# Altium footprint library 2-Pcblib_Cap.PcbLib: 73 footprints (part 5 of 5)
Each footprint in its own frame and in the unit in brackets; x right, y up, seen from the top. Pads: shape width x height; smd on the part's side, far side on the other; paste and mask are expansions set on the pad; w line width, h text height; cw(c..) or ccw(c..) is an arc to the next point about the centre after c.
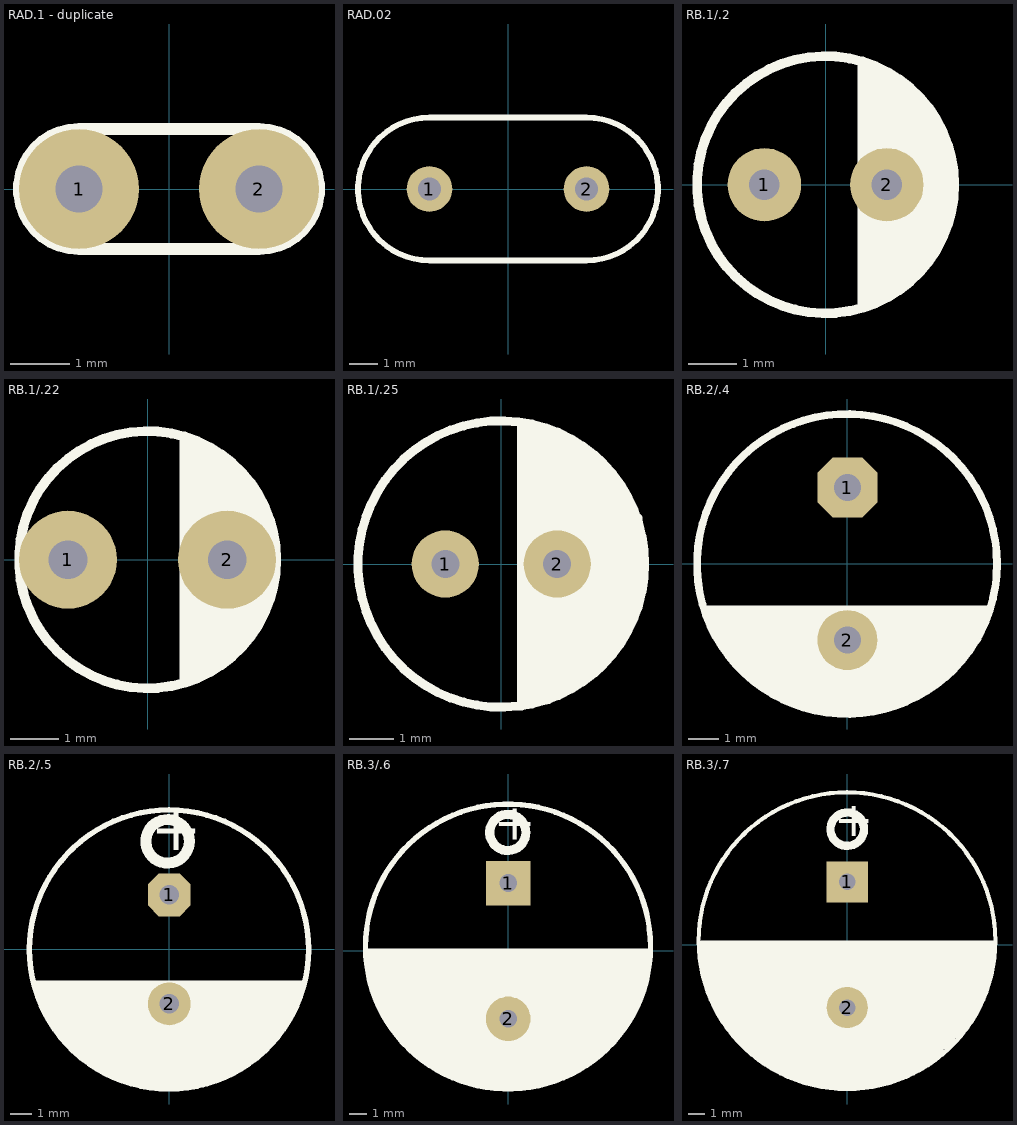
[diagram p4: the footprints below, top view; thin cyan lines are the x and y axes]

## RAD.1 - duplicate [mil]
pads (2):
  round 80 hole 31.5: 1(-60,0) 2(60,0)
Top Overlay:
  lines w8: -60,-40 cw(c-60,0) -60,40 60,40 cw(c60,0) 60,-40 -60,-40

## RAD.02 [mm]
pads (2):
  round 1.6 hole 0.8: 1(-2.75,0) 2(2.75,0)
Top Overlay:
  lines w0.2: -2.75,-2.5 cw(c-2.75,0) -2.75,2.5 2.75,2.5 cw(c2.75,0) 2.75,-2.5 -2.75,-2.5

## RB.1/.2 [mil]
pads (2):
  round 60 hole 25: 1(-50,0) 2(50,0)
Top Overlay:
  circle w8: c0,0 r105
  lines w8: 30,-100 30,100 ; 35,-95 35,95 ; 40,-90 40,95 ; 45,-90 45,90 ; 50,-90 50,85 ; 50,-85 60,-85 ; 55,-80 55,80 ; 55,85 60,80 60,-80 ; 65,-75 65,75 ; 70,-70 70,70 ; 75,-65 75,65 ; 80,-60 80,65 ; 80,-55 85,-55 ; 85,-50 85,50 85,55 ; 90,-45 90,45 ; 95,-35 95,35 ; 100,-25 100,20
Bottom Overlay:
  lines w8: 20,0 25,0
3D body: height 453.76, standoff -128.81, extent -100.43,-99 98.43,99.85

## RB.1/.22 [mil]
pads (2):
  round 80 hole 31.5: 1(-65,0) 2(65,0)
Top Overlay:
  circle w8: c0,0 r105
  lines w8: 30,-100 30,100 ; 35,-95 35,95 ; 40,-90 40,95 ; 45,-90 45,90 ; 50,-90 50,85 ; 50,-85 60,-85 ; 55,-80 55,80 ; 55,85 60,80 60,-80 ; 65,-75 65,75 ; 70,-70 70,70 ; 75,-65 75,65 ; 80,-60 80,65 ; 80,-55 85,-55 ; 85,-50 85,50 85,55 ; 90,-45 90,45 ; 95,-35 95,35 ; 100,-25 100,20
3D body: height 440.94, standoff -740.16, extent -99.43,-100 97.43,96.85

## RB.1/.25 [mil]
pads (2):
  round 60 hole 25: 1(-50,0) 2(50,0)
Top Overlay:
  circle w8: c0,0 r127.95
  lines w8: 18,-127 18,126 ; 26,-122.05 26,125 ; 26,123 33,123 34,122 34,-123 ; 42,-121 42,120 ; 50,-115 50,118 ; 58,-113 58,113 ; 66,-107 66,109 ; 74,-104 74,103 ; 82,-98 82,98 ; 90,-90 90,90 ; 98,-82 98,81 ; 106,-72 106,71 ; 114,-56 114,57 ; 122,-39 122,41
Bottom Overlay:
  lines w8: 20,0 25,0
3D body: height 512.81, standoff -118.67, extent -128,-122.02 122.03,128.02

## RB.2/.4 [mm]
pads (2):
  oct 2x2 hole 0.9: 1(0,2.54)
  round 2 hole 0.9: 2(0,-2.54)
Top Overlay:
  circle w0.254: c-0.013,-0.006 r5
  lines w0.254: -4.75,-1.524 4.724,-1.524 ; -4.648,-1.778 4.572,-1.778 ; -4.547,-2.032 4.547,-2.032 ; -4.47,-2.261 4.369,-2.261 ; -4.318,-2.489 4.343,-2.489 ; -4.14,-2.743 4.14,-2.743 ; -3.988,-2.972 3.962,-2.972 ; -3.759,-3.226 3.785,-3.226 ; -3.556,-3.454 3.505,-3.454 ; -3.302,-3.683 3.302,-3.683 ; -3.099,-3.912 3.023,-3.912 ; -2.794,-4.166 2.743,-4.166 ; -2.337,-4.42 2.337,-4.42 ; -1.803,-4.648 1.829,-4.648 ; -1.067,-4.877 1.067,-4.877
3D body: height 26.86, standoff -16, extent -5.03,-5.009 4.978,5.009

## RB.2/.5 [mm]
pads (2):
  oct 2x2 hole 0.9: 1(0,2.54)
  round 2 hole 0.9: 2(0,-2.54)
Top Overlay:
  circle w0.508: c-0.076,5.029 r1.016
  circle w0.254: c-0.013,-0.006 r6.5
  lines w0.254: -6.274,-1.575 6.172,-1.575 ; -6.248,-1.778 6.172,-1.778 ; -6.121,-1.981 6.071,-1.981 ; -6.096,-2.235 6.045,-2.235 ; -5.944,-2.464 5.893,-2.464 ; -5.817,-2.692 5.817,-2.692 ; -5.715,-2.921 5.69,-2.921 ; -5.664,-3.175 5.563,-3.175 ; -5.461,-3.404 5.461,-3.404 ; -5.385,-3.632 5.359,-3.632 ; -5.156,-3.861 5.156,-3.861 ; -5.029,-4.064 4.978,-4.064 ; -4.801,-4.318 4.826,-4.318 ; -4.623,-4.572 4.547,-4.572 ; -4.267,-4.826 4.242,-4.826 ; -4.039,-5.08 4.013,-5.08 ; -3.607,-5.334 3.658,-5.334 ; -3.251,-5.588 3.226,-5.588 ; -2.819,-5.842 2.819,-5.842 ; -2.286,-6.071 2.235,-6.071 ; -1.524,-6.299 1.549,-6.299
  text "+" at -0.864,3.912 h3.56
3D body: height 25.4, standoff -28.75, extent -6.647,-6.629 6.553,6.571

## RB.3/.6 [mm]
pads (2):
  rect 2.5x2.5 hole 1: 1(0,3.81)
  round 2.5 hole 1: 2(0,-3.81)
Top Overlay:
  circle w0.3: c-0.013,0.248 r8
  circle w0.508: c-0.025,6.655 r1.016
  lines w0.254: -8.001,0 7.925,0
  lines w0.5: -7.823,-0.787 7.798,-0.787 ; -7.798,-0.33 7.823,-0.33 ; -7.747,-1.168 7.696,-1.168 ; -7.671,-1.626 7.62,-1.626 ; -7.569,-2.032 7.493,-2.032 ; -7.417,-2.464 7.366,-2.464 ; -7.29,-2.743 7.264,-2.743 ; -7.137,-3.099 7.061,-3.099 ; -6.858,-3.454 6.883,-3.454 ; -6.604,-3.861 6.68,-3.861 ; -6.426,-4.191 6.477,-4.191 ; -6.198,-4.547 6.248,-4.547 ; -6.045,-4.801 5.994,-4.801 ; -5.664,-5.232 5.639,-5.232 ; -5.156,-5.563 5.334,-5.563 ; -4.877,-5.842 5.004,-5.842 ; -4.496,-6.096 4.674,-6.096 ; -4.039,-6.426 4.267,-6.376 ; -3.556,-6.655 3.861,-6.604 ; -3.099,-6.883 3.302,-6.883 ; -2.565,-7.137 2.591,-7.137 ; -1.753,-7.391 1.956,-7.391
  text "+" at -0.813,5.537 h3.56
3D body: height 25.01, standoff -2.7, extent -7.975,-7.686 8.025,8.255

## RB.3/.7 [mm]
pads (2):
  rect 2.5x2.5 hole 1: 1(0,3.81)
  round 2.5 hole 1: 2(0,-3.81)
Top Overlay:
  circle w0.508: c0,7.01 r1.016
  circle w0.254: c-0.013,0.248 r9
  lines w0.5: -8.8,0 8.8,0 ; -8.775,-0.991 8.7,-0.991 ; -8.698,-1.397 8.6,-1.397 ; -8.648,-1.753 8.6,-1.753 ; -8.521,-2.159 8.5,-2.159 ; -8.368,-2.515 8.357,-2.515 ; -8.216,-2.896 8.255,-2.896 ; -8.103,-3.251 8.077,-3.251 ; -7.886,-3.632 7.925,-3.632 ; -7.759,-4.039 7.671,-4.039 ; -7.505,-4.42 7.391,-4.42 ; -7.301,-4.75 7.264,-4.75 ; -6.971,-5.055 7.01,-5.055 ; -6.768,-5.41 6.731,-5.41 ; -6.438,-5.766 6.35,-5.766 ; -6.158,-6.096 6.096,-6.096 ; -5.777,-6.502 5.664,-6.502 ; -5.295,-6.858 5.283,-6.858 ; -4.787,-7.188 4.851,-7.188 ; -4.253,-7.493 4.343,-7.493 ; -3.644,-7.849 3.632,-7.849 ; -2.907,-8.103 2.946,-8.103 ; -1.917,-8.382 2.007,-8.382
  lines w1: -8.509,-0.483 8.491,-0.483
  text "+" at -0.787,5.893 h3.56
3D body: height 35.51, standoff -2.7, extent -8.983,-8.687 9.017,9.246